# Altium footprint library BGA.PcbLib: 34 footprints (part 1 of 4)
Each footprint in its own frame and in the unit in brackets; x right, y up, seen from the top. Pads: shape width x height; smd on the part's side, far side on the other; paste and mask are expansions set on the pad; w line width, h text height; cw(c..) or ccw(c..) is an arc to the next point about the centre after c.
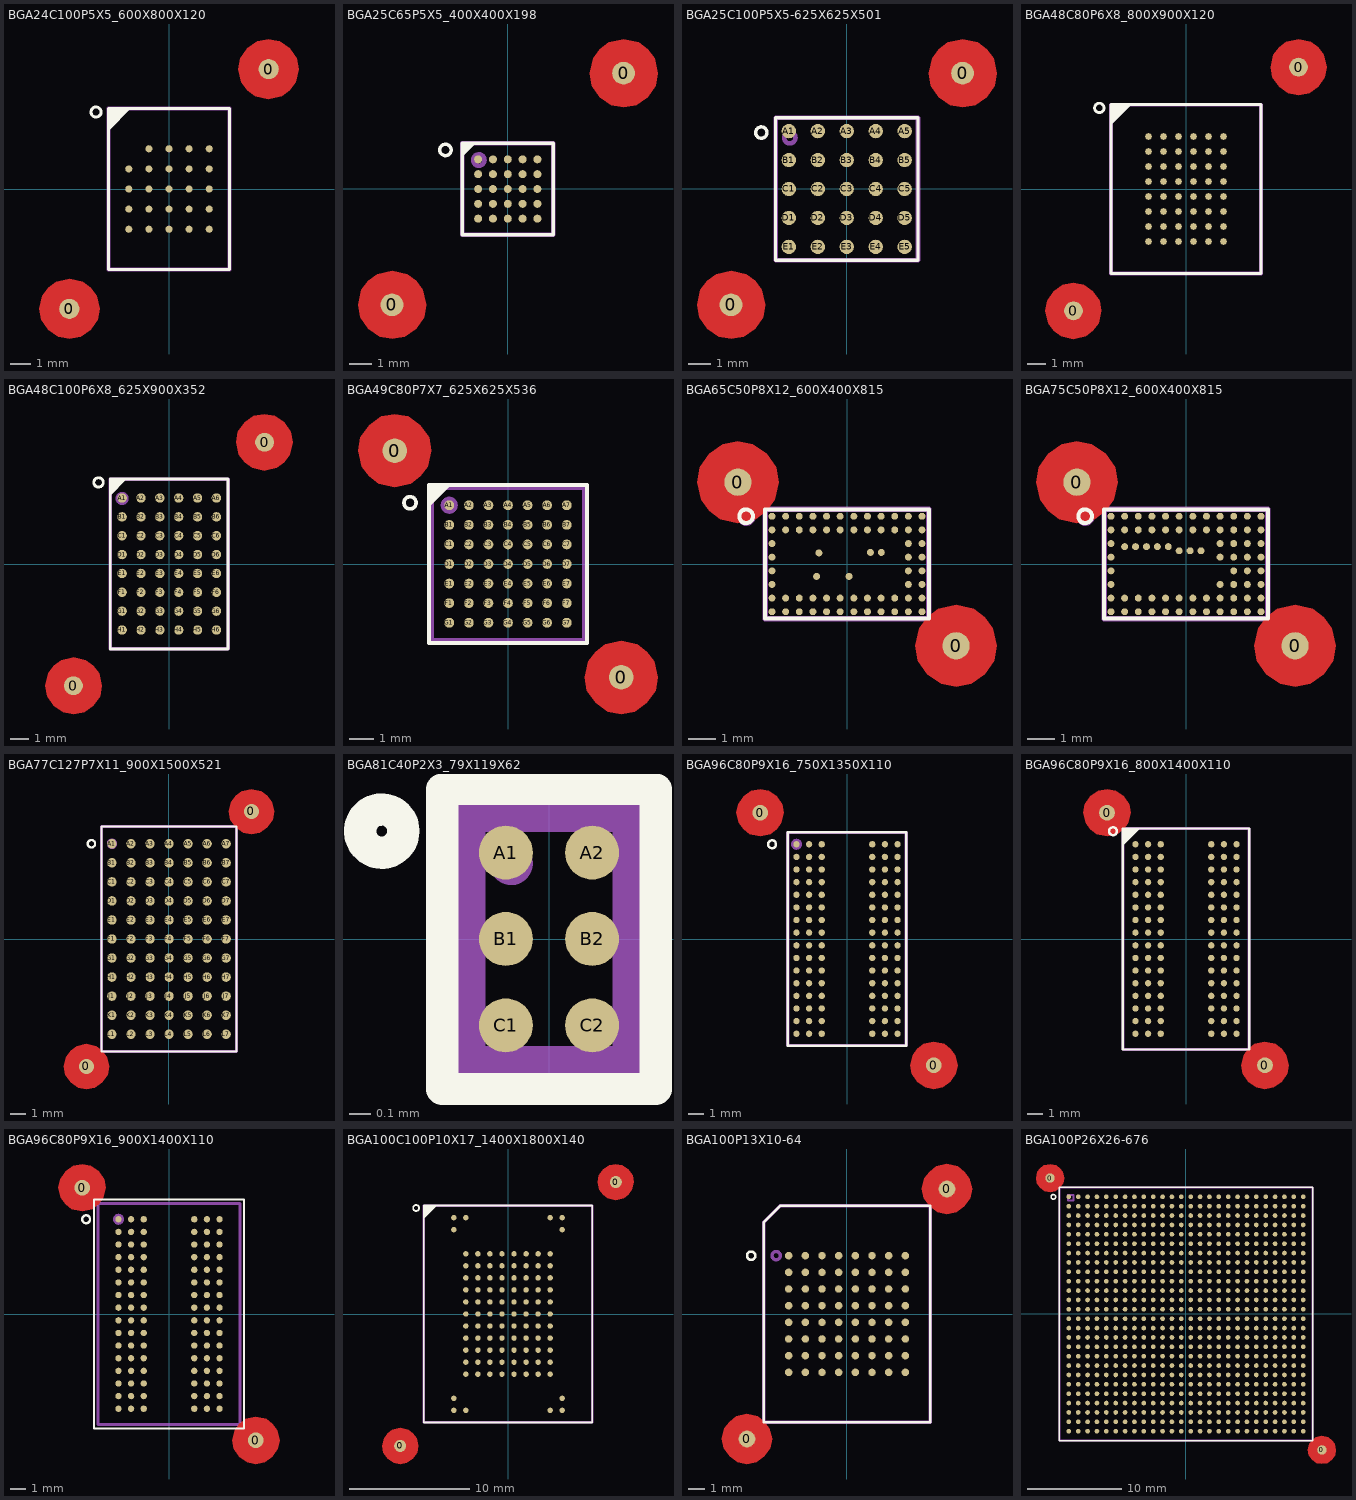
[diagram p0: the footprints below, top view; thin cyan lines are the x and y axes]

## BGA24C100P5X5_600X800X120 [mm] "BGA, 24-Leads, Body 6,00x8,00mmx1,20mm, Pitch 1,00mm"
height 1.2
pads (26):
  round 1 smd paste-1: 0(-4.955,-5.955) 0(4.955,5.955)
  round 0.35 smd paste+0 mask+0.05: A2(-1,2) A3(0,2) A4(1,2) A5(2,2) B1(-2,1) B2(-1,1) B3(0,1) B4(1,1) B5(2,1) C1(-2,0) C2(-1,0) C3(0,0) C4(1,0) C5(2,0) D1(-2,-1) D2(-1,-1) D3(0,-1) D4(1,-1) D5(2,-1) E1(-2,-2) E2(-1,-2) E3(0,-2) E4(1,-2) E5(2,-2)
Top Layer:
  pour cut-out: 6.445,5.955 6.345,6.505 5.995,7.005 5.495,7.355 4.945,7.455 4.395,7.355 3.895,7.005 3.545,6.505 3.445,5.955 3.595,5.305 3.895,4.905 4.295,4.605 4.945,4.455 5.595,4.605 5.995,4.905 6.295,5.305
  pour cut-out: -6.445,-5.955 -6.345,-6.505 -5.995,-7.005 -5.495,-7.355 -4.945,-7.455 -4.395,-7.355 -3.895,-7.005 -3.545,-6.505 -3.445,-5.955 -3.595,-5.305 -3.895,-4.905 -4.295,-4.605 -4.945,-4.455 -5.595,-4.605 -5.995,-4.905 -6.295,-5.305
Top Overlay:
  circle w0.15: c-3.625,3.825 r0.25
  region: -2,4 -3,3 -3,4
  lines w0.15: -3,3 -2,4 ; -3,-4 3,-4 3,4 -3,4 -3,-4
Mechanical 1:
  lines w0.2: -3,-4 3,-4 3,4 -3,4 -3,-4
3D body "BGA25C100P5X5_600X800X120.step": height 1.2, standoff 0, extent -3,-4 3,4

## BGA25C65P5X5_400X400X198 [mm] "BGA, 25-Leads, 5 columns X 5 rows, Body 4,00x4,00mmx1,98mm, Pitch 0,65mm"
height 1.98
pads (27):
  round 1 smd paste-1: 0(-5.08,-5.08) 0(5.08,5.08)
  round 0.35 smd paste+0 mask+0.05: A1(-1.3,1.3) A2(-0.65,1.3) A3(0,1.3) A4(0.65,1.3) A5(1.3,1.3) B1(-1.3,0.65) B2(-0.65,0.65) B3(0,0.65) B4(0.65,0.65) B5(1.3,0.65) C1(-1.3,0) C2(-0.65,0) C3(0,0) C4(0.65,0) C5(1.3,0) D1(-1.3,-0.65) D2(-0.65,-0.65) D3(0,-0.65) D4(0.65,-0.65) D5(1.3,-0.65) E1(-1.3,-1.3) E2(-0.65,-1.3) E3(0,-1.3) E4(0.65,-1.3) E5(1.3,-1.3)
Top Layer:
  pour cut-out: -6.57,-5.08 -6.47,-5.63 -6.12,-6.13 -5.62,-6.48 -5.07,-6.58 -4.52,-6.48 -4.02,-6.13 -3.67,-5.63 -3.57,-5.08 -3.72,-4.43 -4.02,-4.03 -4.42,-3.73 -5.07,-3.58 -5.72,-3.73 -6.12,-4.03 -6.42,-4.43
  pour cut-out: 3.59,5.08 3.69,4.53 4.04,4.03 4.54,3.68 5.09,3.58 5.64,3.68 6.14,4.03 6.49,4.53 6.59,5.08 6.44,5.73 6.14,6.13 5.74,6.43 5.09,6.58 4.44,6.43 4.04,6.13 3.74,5.73
Top Overlay:
  circle w0.15: c-2.734,1.713 r0.25
  region: -1.5,2 -2,1.5 -2,2
  lines w0.15: -2,1.5 -1.5,2 ; -2,-2 -2,2 2,2 2,-2 -2,-2
Mechanical 1:
  circle w0.2: c-1.27,1.27 r0.25
  lines w0.2: -2,-2 -2,2 2,2 2,-2 -2,-2
3D body "BGA25C65P5X5_400X400X198.step": height 1.98, standoff 0, extent -2,-2 2,2

## BGA25C100P5X5-625X625X501 [mm] "BGA, 1.27mm pitch, square; 25 pin, 5 columns X 5 rows, 6.25mm X 6.25mm X 5.01mm"
height 5.21
pads (27):
  round 1 smd paste-1: 0(-5.08,-5.08) 0(5.08,5.08)
  round 0.63 smd paste+0 mask+0.05: A1(-2.54,2.54) A2(-1.27,2.54) A3(0,2.54) A4(1.27,2.54) A5(2.54,2.54) B1(-2.54,1.27) B2(-1.27,1.27) B3(0,1.27) B4(1.27,1.27) B5(2.54,1.27) C1(-2.54,0) C2(-1.27,0) C3(0,0) C4(1.27,0) C5(2.54,0) D1(-2.54,-1.27) D2(-1.27,-1.27) D3(0,-1.27) D4(1.27,-1.27) D5(2.54,-1.27) E1(-2.54,-2.54) E2(-1.27,-2.54) E3(0,-2.54) E4(1.27,-2.54) E5(2.54,-2.54)
Top Layer:
  pour cut-out: -6.57,-5.08 -6.47,-5.63 -6.12,-6.13 -5.62,-6.48 -5.07,-6.58 -4.52,-6.48 -4.02,-6.13 -3.67,-5.63 -3.57,-5.08 -3.72,-4.43 -4.02,-4.03 -4.42,-3.73 -5.07,-3.58 -5.72,-3.73 -6.12,-4.03 -6.42,-4.43
  pour cut-out: 3.59,5.08 3.69,4.53 4.04,4.03 4.54,3.68 5.09,3.58 5.64,3.68 6.14,4.03 6.49,4.53 6.59,5.08 6.44,5.73 6.14,6.13 5.74,6.43 5.09,6.58 4.44,6.43 4.04,6.13 3.74,5.73
Top Overlay:
  circle w0.15: c-3.75,2.475 r0.25
  lines w0.15: -3.125,-3.125 -3.125,3.125 3.125,3.125 3.125,-3.125 -3.125,-3.125
Mechanical 1:
  circle w0.2: c-2.5,2.25 r0.25
  lines w0.2: -3.125,-3.125 -3.125,3.125 3.125,3.125 3.125,-3.125 -3.125,-3.125
3D body "BGA Package 25-Lead.stp": height 5.2, standoff -0.01, extent -3.125,-3.125 3.125,3.125

## BGA48C80P6X8_800X900X120 [mm] "BGA, 48-Leads, Body 8,00x9,00mmx1,20mm, Pitch 0,80mm"
height 1.2
pads (50):
  round 1 smd paste-1: 0(-6,-6.5) 0(6,6.5)
  round 0.35 smd paste+0 mask+0.05: A1(-2,2.8) A2(-1.2,2.8) A3(-0.4,2.8) A4(0.4,2.8) A5(1.2,2.8) A6(2,2.8) B1(-2,2) B2(-1.2,2) B3(-0.4,2) B4(0.4,2) B5(1.2,2) B6(2,2) C1(-2,1.2) C2(-1.2,1.2) C3(-0.4,1.2) C4(0.4,1.2) C5(1.2,1.2) C6(2,1.2) D1(-2,0.4) D2(-1.2,0.4) D3(-0.4,0.4) D4(0.4,0.4) D5(1.2,0.4) D6(2,0.4) E1(-2,-0.4) E2(-1.2,-0.4) E3(-0.4,-0.4) E4(0.4,-0.4) E5(1.2,-0.4) E6(2,-0.4) F1(-2,-1.2) F2(-1.2,-1.2) F3(-0.4,-1.2) F4(0.4,-1.2) F5(1.2,-1.2) F6(2,-1.2) G1(-2,-2) G2(-1.2,-2) G3(-0.4,-2) G4(0.4,-2) G5(1.2,-2) G6(2,-2) H1(-2,-2.8) H2(-1.2,-2.8) H3(-0.4,-2.8) H4(0.4,-2.8) H5(1.2,-2.8) H6(2,-2.8)
Top Layer:
  pour cut-out: 4.51,6.5 4.61,5.95 4.96,5.45 5.46,5.1 6.01,5 6.56,5.1 7.06,5.45 7.41,5.95 7.51,6.5 7.36,7.15 7.06,7.55 6.66,7.85 6.01,8 5.36,7.85 4.96,7.55 4.66,7.15
  pour cut-out: -4.51,-6.5 -4.61,-5.95 -4.96,-5.45 -5.46,-5.1 -6.01,-5 -6.56,-5.1 -7.06,-5.45 -7.41,-5.95 -7.51,-6.5 -7.36,-7.15 -7.06,-7.55 -6.66,-7.85 -6.01,-8 -5.36,-7.85 -4.96,-7.55 -4.66,-7.15
Top Overlay:
  circle w0.15: c-4.625,4.325 r0.25
  region: -3,4.5 -4,3.5 -4,4.5
  lines w0.15: -4,3.5 -3,4.5 ; -4,-4.5 4,-4.5 4,4.5 -4,4.5 -4,-4.5
Mechanical 1:
  lines w0.2: -4,-4.5 4,-4.5 4,4.5 -4,4.5 -4,-4.5
3D body "FS48.stp": height 1.17, standoff 0.01, extent -4,-4.5 4,4.5

## BGA48C100P6X8_625X900X352 [mm] "BGA, 48-Leads, Body 6,25x9,00mmx3,52mm, Pitch 1,00mm"
height 3.52
pads (50):
  round 1 smd paste-1: 0(-5.08,-6.455) 0(5.055,6.455)
  round 0.5 smd paste+0 mask+0.05: A1(-2.5,3.5) A2(-1.5,3.5) A3(-0.5,3.5) A4(0.5,3.5) A5(1.5,3.5) A6(2.5,3.5) B1(-2.5,2.5) B2(-1.5,2.5) B3(-0.5,2.5) B4(0.5,2.5) B5(1.5,2.5) B6(2.5,2.5) C1(-2.5,1.5) C2(-1.5,1.5) C3(-0.5,1.5) C4(0.5,1.5) C5(1.5,1.5) C6(2.5,1.5) D1(-2.5,0.5) D2(-1.5,0.5) D3(-0.5,0.5) D4(0.5,0.5) D5(1.5,0.5) D6(2.5,0.5) E1(-2.5,-0.5) E2(-1.5,-0.5) E3(-0.5,-0.5) E4(0.5,-0.5) E5(1.5,-0.5) E6(2.5,-0.5) F1(-2.5,-1.5) F2(-1.5,-1.5) F3(-0.5,-1.5) F4(0.5,-1.5) F5(1.5,-1.5) F6(2.5,-1.5) G1(-2.5,-2.5) G2(-1.5,-2.5) G3(-0.5,-2.5) G4(0.5,-2.5) G5(1.5,-2.5) G6(2.5,-2.5) H1(-2.5,-3.5) H2(-1.5,-3.5) H3(-0.5,-3.5) H4(0.5,-3.5) H5(1.5,-3.5) H6(2.5,-3.5)
Top Layer:
  pour cut-out: 6.545,6.455 6.445,7.005 6.095,7.505 5.595,7.855 5.045,7.955 4.495,7.855 3.995,7.505 3.645,7.005 3.545,6.455 3.695,5.805 3.995,5.405 4.395,5.105 5.045,4.955 5.695,5.105 6.095,5.405 6.395,5.805
  pour cut-out: -6.57,-6.455 -6.47,-7.005 -6.12,-7.505 -5.62,-7.855 -5.07,-7.955 -4.52,-7.855 -4.02,-7.505 -3.67,-7.005 -3.57,-6.455 -3.72,-5.805 -4.02,-5.405 -4.42,-5.105 -5.07,-4.955 -5.72,-5.105 -6.12,-5.405 -6.42,-5.805
Top Overlay:
  circle w0.15: c-3.75,4.325 r0.25
  region: -2.349,4.5 -3.125,3.724 -3.125,4.5
  lines w0.15: -3.125,3.724 -2.349,4.5 ; -3.125,-4.5 3.125,-4.5 3.125,4.5 -3.125,4.5 -3.125,-4.5
Mechanical 1:
  circle w0.2: c-2.5,3.475 r0.25
  lines w0.2: -3.125,-4.5 3.125,-4.5 3.125,4.5 -3.125,4.5 -3.125,-4.5
3D body "BGA48C100P6X8_625X900X352.step": height 3.52, standoff 0, extent -3.125,-4.5 3.125,4.5

## BGA49C80P7X7_625X625X536 [mm] "BGA, 49-Leads, Body 6,25x6,25mmx5,36mm, Pitch 0,80mm"
height 5.36
pads (51):
  round 1 smd paste-1: 0(-4.625,4.625) 0(4.625,-4.625)
  round 0.4 smd mask+0: A1(-2.4,2.4) A2(-1.6,2.4) A3(-0.8,2.4) A4(0,2.4) A5(0.8,2.4) A6(1.6,2.4) A7(2.4,2.4) B1(-2.4,1.6) B2(-1.6,1.6) B3(-0.8,1.6) B4(0,1.6) B5(0.8,1.6) B6(1.6,1.6) B7(2.4,1.6) C1(-2.4,0.8) C2(-1.6,0.8) C3(-0.8,0.8) C4(0,0.8) C5(0.8,0.8) C6(1.6,0.8) C7(2.4,0.8) D1(-2.4,0) D2(-1.6,0) D3(-0.8,0) D4(0,0) D5(0.8,0) D6(1.6,0) D7(2.4,0) E1(-2.4,-0.8) E2(-1.6,-0.8) E3(-0.8,-0.8) E4(0,-0.8) E5(0.8,-0.8) E6(1.6,-0.8) E7(2.4,-0.8) F1(-2.4,-1.6) F2(-1.6,-1.6) F3(-0.8,-1.6) F4(0,-1.6) F5(0.8,-1.6) F6(1.6,-1.6) F7(2.4,-1.6) G1(-2.4,-2.4) G2(-1.6,-2.4) G3(-0.8,-2.4) G4(0,-2.4) G5(0.8,-2.4) G6(1.6,-2.4) G7(2.4,-2.4)
Top Layer:
  pour cut-out: 3.125,-4.625 3.225,-5.175 3.575,-5.675 4.075,-6.025 4.625,-6.125 5.175,-6.025 5.675,-5.675 6.025,-5.175 6.125,-4.625 5.975,-3.975 5.675,-3.575 5.275,-3.275 4.625,-3.125 3.975,-3.275 3.575,-3.575 3.275,-3.975
  pour cut-out: -3.125,4.625 -3.225,5.175 -3.575,5.675 -4.075,6.025 -4.625,6.125 -5.175,6.025 -5.675,5.675 -6.025,5.175 -6.125,4.625 -5.975,3.975 -5.675,3.575 -5.275,3.275 -4.625,3.125 -3.975,3.275 -3.575,3.575 -3.275,3.975
Top Overlay:
  circle w0.15: c-4,2.5 r0.25
  region: -2.424,3.225 -3.225,2.424 -3.225,3.225
  lines w0.15: -3.225,2.424 -2.424,3.225 ; -3.225,-3.225 -3.225,3.225 3.225,3.225 3.225,-3.225 -3.225,-3.225
Mechanical 1:
  circle w0.2: c-2.4,2.4 r0.25
  lines w0.2: -3.125,-3.125 -3.125,3.125 3.125,3.125 3.125,-3.125 -3.125,-3.125
3D body "BGA49C80P7X7_625X625X536.step": height 5.36, standoff 0, extent -3.125,-3.125 3.125,3.125

## BGA65C50P8X12_600X400X815 [mm] "BGA, 65-Leads, Body 6x4mmx0,815mm, Pitch 0,50mm"
height 0.815
pads (67):
  round 1 smd paste-1: 0(-4,3) 0(4,-3)
  round 0.254 smd paste+0 mask+0.05: A1(-2.75,1.75) A2(-2.25,1.75) A3(-1.75,1.75) A4(-1.25,1.75) A5(-0.75,1.75) A6(-0.25,1.75) A7(0.25,1.75) A8(0.75,1.75) A9(1.25,1.75) A10(1.75,1.75) A11(2.25,1.75) A12(2.75,1.75) B1(-2.75,1.25) B2(-2.25,1.25) B3(-1.75,1.25) B4(-1.25,1.25) B5(-0.75,1.25) B6(-0.25,1.25) B7(0.25,1.25) B8(0.75,1.25) B9(1.25,1.25) B10(1.75,1.25) B11(2.25,1.25) B12(2.75,1.25) C1(-2.75,0.75) C11(2.25,0.75) C12(2.75,0.75) D1(-2.75,0.25) D11(2.25,0.25) D12(2.75,0.25) E1(-2.75,-0.25) E11(2.25,-0.25) E12(2.75,-0.25) EPAD3(-1.03,0.406) EPAD4(0.075,-0.455) EPAD5(-1.115,-0.455) F1(-2.75,-0.75) F11(2.25,-0.75) F12(2.75,-0.75) G1(-2.75,-1.25) G2(-2.25,-1.25) G3(-1.75,-1.25) G4(-1.25,-1.25) G5(-0.75,-1.25) G6(-0.25,-1.25) G7(0.25,-1.25) G8(0.75,-1.25) G9(1.25,-1.25) G10(1.75,-1.25) G11(2.25,-1.25) G12(2.75,-1.25) H1(-2.75,-1.75) H2(-2.25,-1.75) H3(-1.75,-1.75) H4(-1.25,-1.75) H5(-0.75,-1.75) H6(-0.25,-1.75) H7(0.25,-1.75) H8(0.75,-1.75) H9(1.25,-1.75) H10(1.75,-1.75) H11(2.25,-1.75) H12(2.75,-1.75)
  round 0.254 smd paste+0 mask+0.03: EPAD1(1.258,0.425)
  round 0.254 smd mask+0.03: EPAD2(0.858,0.425)
Top Layer:
  pour cut-out: -2.5,3 -2.6,3.55 -2.95,4.05 -3.45,4.4 -4,4.5 -4.55,4.4 -5.05,4.05 -5.4,3.55 -5.5,3 -5.35,2.35 -5.05,1.95 -4.65,1.65 -4,1.5 -3.35,1.65 -2.95,1.95 -2.65,2.35
  pour cut-out: 2.5,-3 2.6,-3.55 2.95,-4.05 3.45,-4.4 4,-4.5 4.55,-4.4 5.05,-4.05 5.4,-3.55 5.5,-3 5.35,-2.35 5.05,-1.95 4.65,-1.65 4,-1.5 3.35,-1.65 2.95,-1.95 2.65,-2.35
Top Overlay:
  circle w0.15: c-3.7,1.75 r0.25
  lines w0.15: -3,-2 3,-2 3,2 -3,2 -3,-2
Mechanical 1:
  circle w0.2: c-3.7,1.75 r0.25
  lines w0.2: -3,-2 3,-2 3,2 -3,2 -3,-2
3D body "HMC6300BG46.stp": height 0.57, standoff -0.19, extent -3,-2 3,2

## BGA75C50P8X12_600X400X815 [mm] "BGA, 75-Leads, Body 6x4mmx0,815mm, Pitch 0,50mm"
height 0.815
pads (77):
  round 1 smd paste-1: 0(-4,3) 0(4,-3)
  round 0.254 smd paste+0 mask+0.05: A1(-2.75,1.75) A2(-2.25,1.75) A3(-1.75,1.75) A4(-1.25,1.75) A5(-0.75,1.75) A6(-0.25,1.75) A7(0.25,1.75) A8(0.75,1.75) A9(1.25,1.75) A10(1.75,1.75) A11(2.25,1.75) A12(2.75,1.75) B1(-2.75,1.25) B2(-2.25,1.25) B3(-1.75,1.25) B4(-1.25,1.25) B5(-0.75,1.25) B6(-0.25,1.25) B7(0.25,1.25) B8(0.75,1.25) B9(1.25,1.25) B10(1.75,1.25) B11(2.25,1.25) B12(2.75,1.25) C1(-2.75,0.75) C9(1.25,0.75) C10(1.75,0.75) C11(2.25,0.75) C12(2.75,0.75) D1(-2.75,0.25) D9(1.25,0.25) D10(1.75,0.25) D11(2.25,0.25) D12(2.75,0.25) E1(-2.75,-0.25) E10(1.75,-0.25) E11(2.25,-0.25) E12(2.75,-0.25) F1(-2.75,-0.75) F9(1.25,-0.75) F10(1.75,-0.75) F11(2.25,-0.75) F12(2.75,-0.75) G1(-2.75,-1.25) G2(-2.25,-1.25) G3(-1.75,-1.25) G4(-1.25,-1.25) G5(-0.75,-1.25) G6(-0.25,-1.25) G7(0.25,-1.25) G8(0.75,-1.25) G9(1.25,-1.25) G10(1.75,-1.25) G11(2.25,-1.25) G12(2.75,-1.25) H1(-2.75,-1.75) H2(-2.25,-1.75) H3(-1.75,-1.75) H4(-1.25,-1.75) H5(-0.75,-1.75) H6(-0.25,-1.75) H7(0.25,-1.75) H8(0.75,-1.75) H9(1.25,-1.75) H10(1.75,-1.75) H11(2.25,-1.75) H12(2.75,-1.75)
  round 0.254 smd paste+0 mask+0.03: EPAD1(0.55,0.485) EPAD2(0.15,0.485) EPAD3(-0.25,0.485) EPAD4(-0.65,0.635) EPAD5(-1.05,0.635) EPAD6(-1.45,0.635) EPAD7(-1.85,0.635) EPAD8(-2.25,0.635)
Top Layer:
  pour cut-out: 2.5,-3 2.6,-3.55 2.95,-4.05 3.45,-4.4 4,-4.5 4.55,-4.4 5.05,-4.05 5.4,-3.55 5.5,-3 5.35,-2.35 5.05,-1.95 4.65,-1.65 4,-1.5 3.35,-1.65 2.95,-1.95 2.65,-2.35
  pour cut-out: -2.5,3 -2.6,3.55 -2.95,4.05 -3.45,4.4 -4,4.5 -4.55,4.4 -5.05,4.05 -5.4,3.55 -5.5,3 -5.35,2.35 -5.05,1.95 -4.65,1.65 -4,1.5 -3.35,1.65 -2.95,1.95 -2.65,2.35
Top Overlay:
  circle w0.15: c-3.7,1.75 r0.25
  lines w0.15: -3,-2 -3,2 3,2 3,-2 -3,-2
Mechanical 1:
  circle w0.2: c-3.7,1.75 r0.25
  lines w0.2: -3,-2 -3,2 3,2 3,-2 -3,-2
3D body "HMC6301BG46.stp": height 0.57, standoff -0.19, extent -3,-2 3,2

## BGA77C127P7X11_900X1500X521 [mm] "BGA, 77-Leads, Body 9,00x15,00mmx5,21mm, Pitch 1,27mm"
height 5.21
pads (79):
  round 1 smd paste-1: 0(-5.5,-8.5) 0(5.5,8.5)
  round 0.63 smd: A1(-3.81,6.35) A2(-2.54,6.35) A3(-1.27,6.35) A4(0,6.35) A5(1.27,6.35) A6(2.54,6.35) A7(3.81,6.35) B1(-3.81,5.08) B2(-2.54,5.08) B3(-1.27,5.08) B4(0,5.08) B5(1.27,5.08) B6(2.54,5.08) B7(3.81,5.08) C1(-3.81,3.81) C2(-2.54,3.81) C3(-1.27,3.81) C4(0,3.81) C5(1.27,3.81) C6(2.54,3.81) C7(3.81,3.81) D1(-3.81,2.54) D2(-2.54,2.54) D3(-1.27,2.54) D4(0,2.54) D5(1.27,2.54) D6(2.54,2.54) D7(3.81,2.54) E1(-3.81,1.27) E2(-2.54,1.27) E3(-1.27,1.27) E4(0,1.27) E5(1.27,1.27) E6(2.54,1.27) E7(3.81,1.27) F1(-3.81,0) F2(-2.54,0) F3(-1.27,0) F4(0,0) F5(1.27,0) F6(2.54,0) F7(3.81,0) G1(-3.81,-1.27) G2(-2.54,-1.27) G3(-1.27,-1.27) G4(0,-1.27) G5(1.27,-1.27) G6(2.54,-1.27) G7(3.81,-1.27) H1(-3.81,-2.54) H2(-2.54,-2.54) H3(-1.27,-2.54) H4(0,-2.54) H5(1.27,-2.54) H6(2.54,-2.54) H7(3.81,-2.54) J1(-3.81,-3.81) J2(-2.54,-3.81) J3(-1.27,-3.81) J4(0,-3.81) J5(1.27,-3.81) J6(2.54,-3.81) J7(3.81,-3.81) K1(-3.81,-5.08) K2(-2.54,-5.08) K3(-1.27,-5.08) K4(0,-5.08) K5(1.27,-5.08) K6(2.54,-5.08) K7(3.81,-5.08) L1(-3.81,-6.35) L2(-2.54,-6.35) L3(-1.27,-6.35) L4(0,-6.35) L5(1.27,-6.35) L6(2.54,-6.35) L7(3.81,-6.35)
Top Layer:
  pour cut-out: 4,8.5 4.1,7.95 4.45,7.45 4.95,7.1 5.5,7 6.05,7.1 6.55,7.45 6.9,7.95 7,8.5 6.85,9.15 6.55,9.55 6.15,9.85 5.5,10 4.85,9.85 4.45,9.55 4.15,9.15
  pour cut-out: -7,-8.5 -6.9,-9.05 -6.55,-9.55 -6.05,-9.9 -5.5,-10 -4.95,-9.9 -4.45,-9.55 -4.1,-9.05 -4,-8.5 -4.15,-7.85 -4.45,-7.45 -4.85,-7.15 -5.5,-7 -6.15,-7.15 -6.55,-7.45 -6.85,-7.85
Top Overlay:
  circle w0.15: c-5.175,6.35 r0.25
  lines w0.15: -4.5,-7.5 -4.5,7.5 4.5,7.5 4.5,-7.5 -4.5,-7.5
Mechanical 1:
  circle w0.2: c-3.8,6.35 r0.25
  lines w0.2: -4.5,-7.5 -4.5,7.5 4.5,7.5 4.5,-7.5 -4.5,-7.5
3D body "BGA77.stp": height 5.01, standoff 0, extent -4.525,-7.5 4.475,7.5

## BGA81C40P2X3_79X119X62 [mm] "BGA, 81-Leads, Body 0,79x1,19mmx0,63mm, Pitch 0,40mm"
height 0.63
pads (6):
  round 0.25 smd paste+0 mask+0.05: A1(-0.2,0.4)
  round 0.25 smd mask+0.05: A2(0.2,0.4) B1(-0.2,0) B2(0.2,0) C1(-0.2,-0.4) C2(0.2,-0.4)
Top Overlay:
  circle w0.15: c-0.775,0.5 r0.1
  lines w0.15: -0.495,-0.695 0.495,-0.695 0.495,-0.437 0.495,0.437 0.495,0.695 -0.495,0.695 -0.495,-0.695
Mechanical 1:
  circle w0.1: c-0.175,0.35 r0.05
  lines w0.2: -0.395,-0.595 -0.395,0.595 0.395,0.595 0.395,-0.595 -0.395,-0.595
3D body "YFF.stp": height 0.64, standoff 0.01, extent -0.4,-0.595 0.39,0.595

## BGA96C80P9X16_750X1350X110 [mm] "BGA, 96-Leads, Body 7,5x13,5mmx1,10mm, Pitch 0,80mm"
height 1.2
pads (98):
  round 1 smd paste-1: 0(-5.5,8) 0(5.5,-8)
  round 0.4 smd paste+0 mask+0.05: A1(-3.2,6) A2(-2.4,6) A3(-1.6,6) A7(1.6,6) A8(2.4,6) A9(3.2,6) B1(-3.2,5.2) B2(-2.4,5.2) B3(-1.6,5.2) B7(1.6,5.2) B8(2.4,5.2) B9(3.2,5.2) C1(-3.2,4.4) C2(-2.4,4.4) C3(-1.6,4.4) C7(1.6,4.4) C8(2.4,4.4) C9(3.2,4.4) D1(-3.2,3.6) D2(-2.4,3.6) D3(-1.6,3.6) D7(1.6,3.6) D8(2.4,3.6) D9(3.2,3.6) E1(-3.2,2.8) E2(-2.4,2.8) E3(-1.6,2.8) E7(1.6,2.8) E8(2.4,2.8) E9(3.2,2.8) F1(-3.2,2) F2(-2.4,2) F3(-1.6,2) F7(1.6,2) F8(2.4,2) F9(3.2,2) G1(-3.2,1.2) G2(-2.4,1.2) G3(-1.6,1.2) G7(1.6,1.2) G8(2.4,1.2) G9(3.2,1.2) H1(-3.2,0.4) H2(-2.4,0.4) H3(-1.6,0.4) H7(1.6,0.4) H8(2.4,0.4) H9(3.2,0.4) J1(-3.2,-0.4) J2(-2.4,-0.4) J3(-1.6,-0.4) J7(1.6,-0.4) J8(2.4,-0.4) J9(3.2,-0.4) K1(-3.2,-1.2) K2(-2.4,-1.2) K3(-1.6,-1.2) K7(1.6,-1.2) K8(2.4,-1.2) K9(3.2,-1.2) L1(-3.2,-2) L2(-2.4,-2) L3(-1.6,-2) L7(1.6,-2) L8(2.4,-2) L9(3.2,-2) M1(-3.2,-2.8) M2(-2.4,-2.8) M3(-1.6,-2.8) M7(1.6,-2.8) M8(2.4,-2.8) M9(3.2,-2.8) N1(-3.2,-3.6) N2(-2.4,-3.6) N3(-1.6,-3.6) N7(1.6,-3.6) N8(2.4,-3.6) N9(3.2,-3.6) P1(-3.2,-4.4) P2(-2.4,-4.4) P3(-1.6,-4.4) P7(1.6,-4.4) P8(2.4,-4.4) P9(3.2,-4.4) R1(-3.2,-5.2) R2(-2.4,-5.2) R3(-1.6,-5.2) R7(1.6,-5.2) R8(2.4,-5.2) R9(3.2,-5.2) T1(-3.2,-6) T2(-2.4,-6) T3(-1.6,-6) T7(1.6,-6) T8(2.4,-6) T9(3.2,-6)
Top Layer:
  pour cut-out: -4,8 -4.1,8.55 -4.45,9.05 -4.95,9.4 -5.5,9.5 -6.05,9.4 -6.55,9.05 -6.9,8.55 -7,8 -6.85,7.35 -6.55,6.95 -6.15,6.65 -5.5,6.5 -4.85,6.65 -4.45,6.95 -4.15,7.35
  pour cut-out: 4,-8 4.1,-8.55 4.45,-9.05 4.95,-9.4 5.5,-9.5 6.05,-9.4 6.55,-9.05 6.9,-8.55 7,-8 6.85,-7.35 6.55,-6.95 6.15,-6.65 5.5,-6.5 4.85,-6.65 4.45,-6.95 4.15,-7.35
Top Overlay:
  circle w0.15: c-4.75,6 r0.25
  lines w0.15: -3.75,-6.75 3.75,-6.75 3.75,6.75 -3.75,6.75 -3.75,-6.75
Mechanical 1:
  circle w0.2: c-3.2,6 r0.25
  lines w0.2: -3.75,-6.75 -3.75,6.75 3.75,6.75 3.75,-6.75 -3.75,-6.75
3D body "96-Ball FBGA – x16 (LY).stp": height 1.1, standoff 0, extent -3.75,-6.75 3.75,6.75

## BGA96C80P9X16_800X1400X110 [mm] "BGA, 96-Leads, Body 8,00x14,00mmx1,10mm, Pitch 0,80mm"
height 1.2
pads (98):
  round 1 smd paste-1: 0(-5,8) 0(5,-8)
  round 0.4 smd paste+0 mask+0.05: A1(-3.2,6) A2(-2.4,6) A3(-1.6,6) A7(1.6,6) A8(2.4,6) A9(3.2,6) B1(-3.2,5.2) B2(-2.4,5.2) B3(-1.6,5.2) B7(1.6,5.2) B8(2.4,5.2) B9(3.2,5.2) C1(-3.2,4.4) C2(-2.4,4.4) C3(-1.6,4.4) C7(1.6,4.4) C8(2.4,4.4) C9(3.2,4.4) D1(-3.2,3.6) D2(-2.4,3.6) D3(-1.6,3.6) D7(1.6,3.6) D8(2.4,3.6) D9(3.2,3.6) E1(-3.2,2.8) E2(-2.4,2.8) E3(-1.6,2.8) E7(1.6,2.8) E8(2.4,2.8) E9(3.2,2.8) F1(-3.2,2) F2(-2.4,2) F3(-1.6,2) F7(1.6,2) F8(2.4,2) F9(3.2,2) G1(-3.2,1.2) G2(-2.4,1.2) G3(-1.6,1.2) G7(1.6,1.2) G8(2.4,1.2) G9(3.2,1.2) H1(-3.2,0.4) H2(-2.4,0.4) H3(-1.6,0.4) H7(1.6,0.4) H8(2.4,0.4) H9(3.2,0.4) J1(-3.2,-0.4) J2(-2.4,-0.4) J3(-1.6,-0.4) J7(1.6,-0.4) J8(2.4,-0.4) J9(3.2,-0.4) K1(-3.2,-1.2) K2(-2.4,-1.2) K3(-1.6,-1.2) K7(1.6,-1.2) K8(2.4,-1.2) K9(3.2,-1.2) L1(-3.2,-2) L2(-2.4,-2) L3(-1.6,-2) L7(1.6,-2) L8(2.4,-2) L9(3.2,-2) M1(-3.2,-2.8) M2(-2.4,-2.8) M3(-1.6,-2.8) M7(1.6,-2.8) M8(2.4,-2.8) M9(3.2,-2.8) N1(-3.2,-3.6) N2(-2.4,-3.6) N3(-1.6,-3.6) N7(1.6,-3.6) N8(2.4,-3.6) N9(3.2,-3.6) P1(-3.2,-4.4) P2(-2.4,-4.4) P3(-1.6,-4.4) P7(1.6,-4.4) P8(2.4,-4.4) P9(3.2,-4.4) R1(-3.2,-5.2) R2(-2.4,-5.2) R3(-1.6,-5.2) R7(1.6,-5.2) R8(2.4,-5.2) R9(3.2,-5.2) T1(-3.2,-6) T2(-2.4,-6) T3(-1.6,-6) T7(1.6,-6) T8(2.4,-6) T9(3.2,-6)
Top Layer:
  pour cut-out: -3.5,8 -3.6,8.55 -3.95,9.05 -4.45,9.4 -5,9.5 -5.55,9.4 -6.05,9.05 -6.4,8.55 -6.5,8 -6.35,7.35 -6.05,6.95 -5.65,6.65 -5,6.5 -4.35,6.65 -3.95,6.95 -3.65,7.35
  pour cut-out: 3.5,-8 3.6,-8.55 3.95,-9.05 4.45,-9.4 5,-9.5 5.55,-9.4 6.05,-9.05 6.4,-8.55 6.5,-8 6.35,-7.35 6.05,-6.95 5.65,-6.65 5,-6.5 4.35,-6.65 3.95,-6.95 3.65,-7.35
Top Overlay:
  circle w0.15: c-4.625,6.825 r0.25
  region: -3.013,7 -4,6.013 -4,7
  lines w0.15: -4,6.013 -3.013,7 ; -4,-7 4,-7 4,7 -4,7 -4,-7
Mechanical 1:
  lines w0.2: -4,-7 4,-7 4,7 -4,7 -4,-7
3D body "BGA96C80P9X16_800X1400X110.step": height 1.1, standoff 0, extent -4,-7 4,7

## BGA96C80P9X16_900X1400X110 [mm] "BGA, 96-Leads, Body 9,00x14,00mmx1,10mm, Pitch 0,80mm"
height 1.1
pads (98):
  round 1 smd paste-1: 0(-5.5,8) 0(5.5,-8)
  round 0.4 smd paste+0 mask+0.05: A1(-3.2,6) A2(-2.4,6) A3(-1.6,6) A7(1.6,6) A8(2.4,6) A9(3.2,6) B1(-3.2,5.2) B2(-2.4,5.2) B3(-1.6,5.2) B7(1.6,5.2) B8(2.4,5.2) B9(3.2,5.2) C1(-3.2,4.4) C2(-2.4,4.4) C3(-1.6,4.4) C7(1.6,4.4) C8(2.4,4.4) C9(3.2,4.4) D1(-3.2,3.6) D2(-2.4,3.6) D3(-1.6,3.6) D7(1.6,3.6) D8(2.4,3.6) D9(3.2,3.6) E1(-3.2,2.8) E2(-2.4,2.8) E3(-1.6,2.8) E7(1.6,2.8) E8(2.4,2.8) E9(3.2,2.8) F1(-3.2,2) F2(-2.4,2) F3(-1.6,2) F7(1.6,2) F8(2.4,2) F9(3.2,2) G1(-3.2,1.2) G2(-2.4,1.2) G3(-1.6,1.2) G7(1.6,1.2) G8(2.4,1.2) G9(3.2,1.2) H1(-3.2,0.4) H2(-2.4,0.4) H3(-1.6,0.4) H7(1.6,0.4) H8(2.4,0.4) H9(3.2,0.4) J1(-3.2,-0.4) J2(-2.4,-0.4) J3(-1.6,-0.4) J7(1.6,-0.4) J8(2.4,-0.4) J9(3.2,-0.4) K1(-3.2,-1.2) K2(-2.4,-1.2) K3(-1.6,-1.2) K7(1.6,-1.2) K8(2.4,-1.2) K9(3.2,-1.2) L1(-3.2,-2) L2(-2.4,-2) L3(-1.6,-2) L7(1.6,-2) L8(2.4,-2) L9(3.2,-2) M1(-3.2,-2.8) M2(-2.4,-2.8) M3(-1.6,-2.8) M7(1.6,-2.8) M8(2.4,-2.8) M9(3.2,-2.8) N1(-3.2,-3.6) N2(-2.4,-3.6) N3(-1.6,-3.6) N7(1.6,-3.6) N8(2.4,-3.6) N9(3.2,-3.6) P1(-3.2,-4.4) P2(-2.4,-4.4) P3(-1.6,-4.4) P7(1.6,-4.4) P8(2.4,-4.4) P9(3.2,-4.4) R1(-3.2,-5.2) R2(-2.4,-5.2) R3(-1.6,-5.2) R7(1.6,-5.2) R8(2.4,-5.2) R9(3.2,-5.2) T1(-3.2,-6) T2(-2.4,-6) T3(-1.6,-6) T7(1.6,-6) T8(2.4,-6) T9(3.2,-6)
Top Layer:
  pour cut-out: -4,8 -4.1,8.55 -4.45,9.05 -4.95,9.4 -5.5,9.5 -6.05,9.4 -6.55,9.05 -6.9,8.55 -7,8 -6.85,7.35 -6.55,6.95 -6.15,6.65 -5.5,6.5 -4.85,6.65 -4.45,6.95 -4.15,7.35
  pour cut-out: 4,-8 4.1,-8.55 4.45,-9.05 4.95,-9.4 5.5,-9.5 6.05,-9.4 6.55,-9.05 6.9,-8.55 7,-8 6.85,-7.35 6.55,-6.95 6.15,-6.65 5.5,-6.5 4.85,-6.65 4.45,-6.95 4.15,-7.35
Top Overlay:
  circle w0.15: c-5.25,6 r0.25
  lines w0.15: -4.75,-7.25 4.75,-7.25 4.75,7.25 -4.75,7.25 -4.75,-7.25
Mechanical 1:
  circle w0.2: c-3.2,6 r0.25
  lines w0.2: -4.5,-7 -4.5,7 4.5,7 4.5,-7 -4.5,-7
3D body "MT41K256M16HA-125 IT.stp": height 1.25, standoff 0, extent -4.5,-7 4.5,7

## BGA100C100P10X17_1400X1800X140 [mm] "BGA, 100-Leads, Body 14,00x18 mmx1,40mm, Pitch 1,00mm"
height 1.4
pads (102):
  round 1 smd paste-1: 0(-8.955,-10.955) 0(8.955,10.955)
  round 0.45 smd paste+0 mask+0.05: A1(-4.5,8) A2(-3.5,8) A9(3.5,8) A10(4.5,8) B1(-4.5,7) B10(4.5,7) D2(-3.5,5) D3(-2.5,5) D4(-1.5,5) D5(-0.5,5) D6(0.5,5) D7(1.5,5) D8(2.5,5) D9(3.5,5) E2(-3.5,4) E3(-2.5,4) E4(-1.5,4) E5(-0.5,4) E6(0.5,4) E7(1.5,4) E8(2.5,4) E9(3.5,4) F2(-3.5,3) F3(-2.5,3) F4(-1.5,3) F5(-0.5,3) F6(0.5,3) F7(1.5,3) F8(2.5,3) F9(3.5,3) G2(-3.5,2) G3(-2.5,2) G4(-1.5,2) G5(-0.5,2) G6(0.5,2) G7(1.5,2) G8(2.5,2) G9(3.5,2) H2(-3.5,1) H3(-2.5,1) H4(-1.5,1) H5(-0.5,1) H6(0.5,1) H7(1.5,1) H8(2.5,1) H9(3.5,1) J2(-3.5,0) J3(-2.5,0) J4(-1.5,0) J5(-0.5,0) J6(0.5,0) J7(1.5,0) J8(2.5,0) J9(3.5,0) K2(-3.5,-1) K3(-2.5,-1) K4(-1.5,-1) K5(-0.5,-1) K6(0.5,-1) K7(1.5,-1) K8(2.5,-1) K9(3.5,-1) L2(-3.5,-2) L3(-2.5,-2) L4(-1.5,-2) L5(-0.5,-2) L6(0.5,-2) L7(1.5,-2) L8(2.5,-2) L9(3.5,-2) M2(-3.5,-3) M3(-2.5,-3) M4(-1.5,-3) M5(-0.5,-3) M6(0.5,-3) M7(1.5,-3) M8(2.5,-3) M9(3.5,-3) N2(-3.5,-4) N3(-2.5,-4) N4(-1.5,-4) N5(-0.5,-4) N6(0.5,-4) N7(1.5,-4) N8(2.5,-4) N9(3.5,-4) P2(-3.5,-5) P3(-2.5,-5) P4(-1.5,-5) P5(-0.5,-5) P6(0.5,-5) P7(1.5,-5) P8(2.5,-5) P9(3.5,-5) T1(-4.5,-7) T10(4.5,-7) U1(-4.5,-8) U2(-3.5,-8) U9(3.5,-8) U10(4.5,-8)
Top Layer:
  pour cut-out: -10.445,-10.955 -10.345,-11.505 -9.995,-12.005 -9.495,-12.355 -8.945,-12.455 -8.395,-12.355 -7.895,-12.005 -7.545,-11.505 -7.445,-10.955 -7.595,-10.305 -7.895,-9.905 -8.295,-9.605 -8.945,-9.455 -9.595,-9.605 -9.995,-9.905 -10.295,-10.305
  pour cut-out: 10.445,10.955 10.345,11.505 9.995,12.005 9.495,12.355 8.945,12.455 8.395,12.355 7.895,12.005 7.545,11.505 7.445,10.955 7.595,10.305 7.895,9.905 8.295,9.605 8.945,9.455 9.595,9.605 9.995,9.905 10.295,10.305
Top Overlay:
  circle w0.15: c-7.625,8.8 r0.25
  region: -6,8.975 -7,7.975 -7,8.975
  lines w0.15: -7,-9 7,-9 ; -7,-8.975 -7,8.975 ; -7,7.975 -6,8.975 ; -7,9 7,9 ; 7,-8.975 7,8.975
Mechanical 1:
  lines w0.2: -7,-9 7,-9 ; -7,-8.975 -7,8.975 ; -7,9 7,9 ; 7,-8.975 7,8.975
3D body: height 1.4, standoff 0.32, extent -7,-8.975 7,8.975

## BGA100P13X10-64 [mm] "BGA, 64-Leads, Body 10.0x13.0mm,  Pitch 1.00mm"
height 1.2
pads (66):
  round 1 smd paste-1: 0(-6,-7.5) 0(6,7.5)
  round 0.45 smd paste+0 mask+0.05: A1(-3.5,3.5) A2(-2.5,3.5) A3(-1.5,3.5) A4(-0.5,3.5) A5(0.5,3.5) A6(1.5,3.5) A7(2.5,3.5) A8(3.5,3.5) B1(-3.5,2.5) B2(-2.5,2.5) B3(-1.5,2.5) B4(-0.5,2.5) B5(0.5,2.5) B6(1.5,2.5) B7(2.5,2.5) B8(3.5,2.5) C1(-3.5,1.5) C2(-2.5,1.5) C3(-1.5,1.5) C4(-0.5,1.5) C5(0.5,1.5) C6(1.5,1.5) C7(2.5,1.5) C8(3.5,1.5) D1(-3.5,0.5) D2(-2.5,0.5) D3(-1.5,0.5) D4(-0.5,0.5) D5(0.5,0.5) D6(1.5,0.5) D7(2.5,0.5) D8(3.5,0.5) E1(-3.5,-0.5) E2(-2.5,-0.5) E3(-1.5,-0.5) E4(-0.5,-0.5) E5(0.5,-0.5) E6(1.5,-0.5) E7(2.5,-0.5) E8(3.5,-0.5) F1(-3.5,-1.5) F2(-2.5,-1.5) F3(-1.5,-1.5) F4(-0.5,-1.5) F5(0.5,-1.5) F6(1.5,-1.5) F7(2.5,-1.5) F8(3.5,-1.5) G1(-3.5,-2.5) G2(-2.5,-2.5) G3(-1.5,-2.5) G4(-0.5,-2.5) G5(0.5,-2.5) G6(1.5,-2.5) G7(2.5,-2.5) G8(3.5,-2.5) H1(-3.5,-3.5) H2(-2.5,-3.5) H3(-1.5,-3.5) H4(-0.5,-3.5) H5(0.5,-3.5) H6(1.5,-3.5) H7(2.5,-3.5) H8(3.5,-3.5)
Top Layer:
  pour cut-out: 4.5,7.5 4.6,6.95 4.95,6.45 5.45,6.1 6,6 6.55,6.1 7.05,6.45 7.4,6.95 7.5,7.5 7.35,8.15 7.05,8.55 6.65,8.85 6,9 5.35,8.85 4.95,8.55 4.65,8.15
  pour cut-out: -7.5,-7.5 -7.4,-8.05 -7.05,-8.55 -6.55,-8.9 -6,-9 -5.45,-8.9 -4.95,-8.55 -4.6,-8.05 -4.5,-7.5 -4.65,-6.85 -4.95,-6.45 -5.35,-6.15 -6,-6 -6.65,-6.15 -7.05,-6.45 -7.35,-6.85
Top Overlay:
  circle w0.15: c-5.75,3.5 r0.25
  lines w0.15: -5,-6.5 -5,5.5 -4,6.5 5,6.5 5,-6.5 -5,-6.5
Mechanical 1:
  circle w0.2: c-4.25,3.5 r0.25
  lines w0.2: -5,-6.5 -5,5.5 -4,6.5 5,6.5 5,-6.5 -5,-6.5
3D body "64-Ball Easy BGA.STEP": height 1.01, standoff -0.02, extent -5,-6.5 5,6.5

## BGA100P26X26-676 [mm] "BGA, 676-Leads, Body 27x27mm, Pitch 1mm"
height 2.54
pads (678):
  round 1 smd paste-1: 0(-14.5,14.5) 0(14.5,-14.5)
  round 0.5 smd paste+0 mask+0.05: A1(-12.5,12.5) A2(-11.5,12.5) A3(-10.5,12.5) A4(-9.5,12.5) A5(-8.5,12.5) A6(-7.5,12.5) A7(-6.5,12.5) A8(-5.5,12.5) A9(-4.5,12.5) A10(-3.5,12.5) A11(-2.5,12.5) A12(-1.5,12.5) A13(-0.5,12.5) A14(0.5,12.5) A15(1.5,12.5) A16(2.5,12.5) A17(3.5,12.5) A18(4.5,12.5) A19(5.5,12.5) A20(6.5,12.5) A21(7.5,12.5) A22(8.5,12.5) A23(9.5,12.5) A24(10.5,12.5) A25(11.5,12.5) A26(12.5,12.5) AA1(-12.5,-7.5) AA2(-11.5,-7.5) AA3(-10.5,-7.5) AA4(-9.5,-7.5) AA5(-8.5,-7.5) AA6(-7.5,-7.5) AA7(-6.5,-7.5) AA8(-5.5,-7.5) AA9(-4.5,-7.5) AA10(-3.5,-7.5) AA11(-2.5,-7.5) AA12(-1.5,-7.5) AA13(-0.5,-7.5) AA14(0.5,-7.5) AA15(1.5,-7.5) AA16(2.5,-7.5) AA17(3.5,-7.5) AA18(4.5,-7.5) AA19(5.5,-7.5) AA20(6.5,-7.5) AA21(7.5,-7.5) AA22(8.5,-7.5) AA23(9.5,-7.5) AA24(10.5,-7.5) AA25(11.5,-7.5) AA26(12.5,-7.5) AB1(-12.5,-8.5) AB2(-11.5,-8.5) AB3(-10.5,-8.5) AB4(-9.5,-8.5) AB5(-8.5,-8.5) AB6(-7.5,-8.5) AB7(-6.5,-8.5) AB8(-5.5,-8.5) AB9(-4.5,-8.5) AB10(-3.5,-8.5) AB11(-2.5,-8.5) AB12(-1.5,-8.5) AB13(-0.5,-8.5) AB14(0.5,-8.5) AB15(1.5,-8.5) AB16(2.5,-8.5) AB17(3.5,-8.5) AB18(4.5,-8.5) AB19(5.5,-8.5) AB20(6.5,-8.5) AB21(7.5,-8.5) AB22(8.5,-8.5) AB23(9.5,-8.5) AB24(10.5,-8.5) AB25(11.5,-8.5) AB26(12.5,-8.5) AC1(-12.5,-9.5) AC2(-11.5,-9.5) AC3(-10.5,-9.5) AC4(-9.5,-9.5) AC5(-8.5,-9.5) AC6(-7.5,-9.5) AC7(-6.5,-9.5) AC8(-5.5,-9.5) AC9(-4.5,-9.5) AC10(-3.5,-9.5) AC11(-2.5,-9.5) AC12(-1.5,-9.5) AC13(-0.5,-9.5) AC14(0.5,-9.5) AC15(1.5,-9.5) AC16(2.5,-9.5) AC17(3.5,-9.5) AC18(4.5,-9.5) AC19(5.5,-9.5) AC20(6.5,-9.5) AC21(7.5,-9.5) AC22(8.5,-9.5) AC23(9.5,-9.5) AC24(10.5,-9.5) AC25(11.5,-9.5) AC26(12.5,-9.5) AD1(-12.5,-10.5) AD2(-11.5,-10.5) AD3(-10.5,-10.5) AD4(-9.5,-10.5) AD5(-8.5,-10.5) AD6(-7.5,-10.5) AD7(-6.5,-10.5) AD8(-5.5,-10.5) AD9(-4.5,-10.5) AD10(-3.5,-10.5) AD11(-2.5,-10.5) AD12(-1.5,-10.5) AD13(-0.5,-10.5) AD14(0.5,-10.5) AD15(1.5,-10.5) AD16(2.5,-10.5) AD17(3.5,-10.5) AD18(4.5,-10.5) AD19(5.5,-10.5) AD20(6.5,-10.5) AD21(7.5,-10.5) AD22(8.5,-10.5) AD23(9.5,-10.5) AD24(10.5,-10.5) AD25(11.5,-10.5) AD26(12.5,-10.5) AE1(-12.5,-11.5) AE2(-11.5,-11.5) AE3(-10.5,-11.5) AE4(-9.5,-11.5) AE5(-8.5,-11.5) AE6(-7.5,-11.5) AE7(-6.5,-11.5) AE8(-5.5,-11.5) AE9(-4.5,-11.5) AE10(-3.5,-11.5) AE11(-2.5,-11.5) AE12(-1.5,-11.5) AE13(-0.5,-11.5) AE14(0.5,-11.5) AE15(1.5,-11.5) AE16(2.5,-11.5) AE17(3.5,-11.5) AE18(4.5,-11.5) AE19(5.5,-11.5) AE20(6.5,-11.5) AE21(7.5,-11.5) AE22(8.5,-11.5) AE23(9.5,-11.5) AE24(10.5,-11.5) AE25(11.5,-11.5) AE26(12.5,-11.5) AF1(-12.5,-12.5) AF2(-11.5,-12.5) AF3(-10.5,-12.5) AF4(-9.5,-12.5) AF5(-8.5,-12.5) AF6(-7.5,-12.5) AF7(-6.5,-12.5) AF8(-5.5,-12.5) AF9(-4.5,-12.5) AF10(-3.5,-12.5) AF11(-2.5,-12.5) AF12(-1.5,-12.5) AF13(-0.5,-12.5) AF14(0.5,-12.5) AF15(1.5,-12.5) AF16(2.5,-12.5) AF17(3.5,-12.5) AF18(4.5,-12.5) AF19(5.5,-12.5) AF20(6.5,-12.5) AF21(7.5,-12.5) AF22(8.5,-12.5) AF23(9.5,-12.5) AF24(10.5,-12.5) AF25(11.5,-12.5) AF26(12.5,-12.5) B1(-12.5,11.5) B2(-11.5,11.5) B3(-10.5,11.5) B4(-9.5,11.5) B5(-8.5,11.5) B6(-7.5,11.5) B7(-6.5,11.5) B8(-5.5,11.5) B9(-4.5,11.5) B10(-3.5,11.5) B11(-2.5,11.5) B12(-1.5,11.5) B13(-0.5,11.5) B14(0.5,11.5) B15(1.5,11.5) B16(2.5,11.5) B17(3.5,11.5) B18(4.5,11.5) B19(5.5,11.5) B20(6.5,11.5) B21(7.5,11.5) B22(8.5,11.5) B23(9.5,11.5) B24(10.5,11.5) B25(11.5,11.5) B26(12.5,11.5) C1(-12.5,10.5) C2(-11.5,10.5) C3(-10.5,10.5) C4(-9.5,10.5) C5(-8.5,10.5) C6(-7.5,10.5) C7(-6.5,10.5) C8(-5.5,10.5) C9(-4.5,10.5) C10(-3.5,10.5) C11(-2.5,10.5) C12(-1.5,10.5) C13(-0.5,10.5) C14(0.5,10.5) C15(1.5,10.5) C16(2.5,10.5) C17(3.5,10.5) C18(4.5,10.5) C19(5.5,10.5) C20(6.5,10.5) C21(7.5,10.5) C22(8.5,10.5) C23(9.5,10.5) C24(10.5,10.5) C25(11.5,10.5) C26(12.5,10.5) D1(-12.5,9.5) D2(-11.5,9.5) D3(-10.5,9.5) D4(-9.5,9.5) D5(-8.5,9.5) D6(-7.5,9.5) D7(-6.5,9.5) D8(-5.5,9.5) D9(-4.5,9.5) D10(-3.5,9.5) D11(-2.5,9.5) D12(-1.5,9.5) D13(-0.5,9.5) D14(0.5,9.5) D15(1.5,9.5) D16(2.5,9.5) D17(3.5,9.5) D18(4.5,9.5) D19(5.5,9.5) D20(6.5,9.5) D21(7.5,9.5) D22(8.5,9.5) D23(9.5,9.5) D24(10.5,9.5) D25(11.5,9.5) D26(12.5,9.5) E1(-12.5,8.5) E2(-11.5,8.5) E3(-10.5,8.5) E4(-9.5,8.5) E5(-8.5,8.5) E6(-7.5,8.5) E7(-6.5,8.5) E8(-5.5,8.5) E9(-4.5,8.5) E10(-3.5,8.5) E11(-2.5,8.5) E12(-1.5,8.5) E13(-0.5,8.5) E14(0.5,8.5) E15(1.5,8.5) E16(2.5,8.5) E17(3.5,8.5) E18(4.5,8.5) E19(5.5,8.5) E20(6.5,8.5) E21(7.5,8.5) E22(8.5,8.5) E23(9.5,8.5) E24(10.5,8.5) E25(11.5,8.5) E26(12.5,8.5) F1(-12.5,7.5) F2(-11.5,7.5) F3(-10.5,7.5) F4(-9.5,7.5) F5(-8.5,7.5) F6(-7.5,7.5) F7(-6.5,7.5) F8(-5.5,7.5) F9(-4.5,7.5) F10(-3.5,7.5) F11(-2.5,7.5) F12(-1.5,7.5) F13(-0.5,7.5) F14(0.5,7.5) F15(1.5,7.5) F16(2.5,7.5) F17(3.5,7.5) F18(4.5,7.5) F19(5.5,7.5) F20(6.5,7.5) F21(7.5,7.5) F22(8.5,7.5) F23(9.5,7.5) F24(10.5,7.5) F25(11.5,7.5) F26(12.5,7.5) G1(-12.5,6.5) G2(-11.5,6.5) G3(-10.5,6.5) G4(-9.5,6.5) G5(-8.5,6.5) G6(-7.5,6.5) G7(-6.5,6.5) G8(-5.5,6.5) G9(-4.5,6.5) G10(-3.5,6.5) G11(-2.5,6.5) G12(-1.5,6.5) G13(-0.5,6.5) G14(0.5,6.5) G15(1.5,6.5) G16(2.5,6.5) G17(3.5,6.5) G18(4.5,6.5) G19(5.5,6.5) G20(6.5,6.5) G21(7.5,6.5) G22(8.5,6.5) G23(9.5,6.5) G24(10.5,6.5) G25(11.5,6.5) G26(12.5,6.5) H1(-12.5,5.5) H2(-11.5,5.5) H3(-10.5,5.5) H4(-9.5,5.5) H5(-8.5,5.5) H6(-7.5,5.5) H7(-6.5,5.5) H8(-5.5,5.5) H9(-4.5,5.5) H10(-3.5,5.5) H11(-2.5,5.5) H12(-1.5,5.5) H13(-0.5,5.5) H14(0.5,5.5) H15(1.5,5.5) H16(2.5,5.5) H17(3.5,5.5) H18(4.5,5.5) H19(5.5,5.5) H20(6.5,5.5) H21(7.5,5.5) H22(8.5,5.5) H23(9.5,5.5) H24(10.5,5.5) H25(11.5,5.5) H26(12.5,5.5) J1(-12.5,4.5) J2(-11.5,4.5) J3(-10.5,4.5) J4(-9.5,4.5) J5(-8.5,4.5) J6(-7.5,4.5) J7(-6.5,4.5) J8(-5.5,4.5) J9(-4.5,4.5) J10(-3.5,4.5) J11(-2.5,4.5) J12(-1.5,4.5) J13(-0.5,4.5) J14(0.5,4.5) J15(1.5,4.5) J16(2.5,4.5) J17(3.5,4.5) J18(4.5,4.5) J19(5.5,4.5) J20(6.5,4.5) J21(7.5,4.5) J22(8.5,4.5) J23(9.5,4.5) J24(10.5,4.5) J25(11.5,4.5) J26(12.5,4.5) K1(-12.5,3.5) K2(-11.5,3.5) K3(-10.5,3.5) K4(-9.5,3.5) K5(-8.5,3.5) K6(-7.5,3.5) K7(-6.5,3.5) K8(-5.5,3.5) K9(-4.5,3.5) K10(-3.5,3.5) K11(-2.5,3.5) K12(-1.5,3.5) K13(-0.5,3.5) K14(0.5,3.5) K15(1.5,3.5) K16(2.5,3.5) K17(3.5,3.5) K18(4.5,3.5) K19(5.5,3.5) K20(6.5,3.5) K21(7.5,3.5) K22(8.5,3.5) K23(9.5,3.5) K24(10.5,3.5) K25(11.5,3.5) K26(12.5,3.5) L1(-12.5,2.5) L2(-11.5,2.5) L3(-10.5,2.5) L4(-9.5,2.5) L5(-8.5,2.5) L6(-7.5,2.5) L7(-6.5,2.5) L8(-5.5,2.5) L9(-4.5,2.5) L10(-3.5,2.5) L11(-2.5,2.5) L12(-1.5,2.5) L13(-0.5,2.5) L14(0.5,2.5) L15(1.5,2.5) L16(2.5,2.5) L17(3.5,2.5) L18(4.5,2.5) L19(5.5,2.5) L20(6.5,2.5) L21(7.5,2.5) L22(8.5,2.5) L23(9.5,2.5) L24(10.5,2.5) L25(11.5,2.5) L26(12.5,2.5) M1(-12.5,1.5) M2(-11.5,1.5) M3(-10.5,1.5) M4(-9.5,1.5) M5(-8.5,1.5) M6(-7.5,1.5) M7(-6.5,1.5) M8(-5.5,1.5) M9(-4.5,1.5) M10(-3.5,1.5) M11(-2.5,1.5) M12(-1.5,1.5) M13(-0.5,1.5) M14(0.5,1.5) M15(1.5,1.5) M16(2.5,1.5) M17(3.5,1.5) M18(4.5,1.5) M19(5.5,1.5) M20(6.5,1.5) M21(7.5,1.5) M22(8.5,1.5) M23(9.5,1.5) M24(10.5,1.5) M25(11.5,1.5) M26(12.5,1.5) N1(-12.5,0.5) N2(-11.5,0.5) N3(-10.5,0.5) N4(-9.5,0.5) N5(-8.5,0.5) N6(-7.5,0.5) N7(-6.5,0.5) N8(-5.5,0.5) N9(-4.5,0.5) N10(-3.5,0.5) N11(-2.5,0.5) N12(-1.5,0.5) N13(-0.5,0.5) N14(0.5,0.5) N15(1.5,0.5) N16(2.5,0.5) N17(3.5,0.5) N18(4.5,0.5) N19(5.5,0.5) N20(6.5,0.5) N21(7.5,0.5) N22(8.5,0.5) N23(9.5,0.5) N24(10.5,0.5) N25(11.5,0.5) N26(12.5,0.5) P1(-12.5,-0.5) P2(-11.5,-0.5) P3(-10.5,-0.5) P4(-9.5,-0.5) P5(-8.5,-0.5) P6(-7.5,-0.5) P7(-6.5,-0.5) P8(-5.5,-0.5) P9(-4.5,-0.5) P10(-3.5,-0.5) P11(-2.5,-0.5) P12(-1.5,-0.5) P13(-0.5,-0.5) P14(0.5,-0.5) P15(1.5,-0.5) P16(2.5,-0.5) P17(3.5,-0.5) P18(4.5,-0.5) P19(5.5,-0.5) P20(6.5,-0.5) P21(7.5,-0.5) P22(8.5,-0.5) P23(9.5,-0.5) P24(10.5,-0.5) P25(11.5,-0.5) P26(12.5,-0.5) R1(-12.5,-1.5) R2(-11.5,-1.5) R3(-10.5,-1.5) R4(-9.5,-1.5) R5(-8.5,-1.5) R6(-7.5,-1.5) R7(-6.5,-1.5) R8(-5.5,-1.5) R9(-4.5,-1.5) R10(-3.5,-1.5) R11(-2.5,-1.5) R12(-1.5,-1.5) R13(-0.5,-1.5) R14(0.5,-1.5) R15(1.5,-1.5) R16(2.5,-1.5) R17(3.5,-1.5) R18(4.5,-1.5) R19(5.5,-1.5) R20(6.5,-1.5) R21(7.5,-1.5) R22(8.5,-1.5) R23(9.5,-1.5) R24(10.5,-1.5) R25(11.5,-1.5) R26(12.5,-1.5) T1(-12.5,-2.5) T2(-11.5,-2.5) T3(-10.5,-2.5) T4(-9.5,-2.5) T5(-8.5,-2.5) T6(-7.5,-2.5) T7(-6.5,-2.5) T8(-5.5,-2.5) T9(-4.5,-2.5) T10(-3.5,-2.5) T11(-2.5,-2.5) T12(-1.5,-2.5) T13(-0.5,-2.5) T14(0.5,-2.5) T15(1.5,-2.5) T16(2.5,-2.5) T17(3.5,-2.5) T18(4.5,-2.5) T19(5.5,-2.5) T20(6.5,-2.5) T21(7.5,-2.5) T22(8.5,-2.5) T23(9.5,-2.5) T24(10.5,-2.5) T25(11.5,-2.5) T26(12.5,-2.5) U1(-12.5,-3.5) U2(-11.5,-3.5) U3(-10.5,-3.5) U4(-9.5,-3.5) U5(-8.5,-3.5) U6(-7.5,-3.5) U7(-6.5,-3.5) U8(-5.5,-3.5) U9(-4.5,-3.5) U10(-3.5,-3.5) U11(-2.5,-3.5) U12(-1.5,-3.5) U13(-0.5,-3.5) U14(0.5,-3.5) U15(1.5,-3.5) U16(2.5,-3.5) U17(3.5,-3.5) U18(4.5,-3.5) U19(5.5,-3.5) U20(6.5,-3.5) U21(7.5,-3.5) U22(8.5,-3.5) U23(9.5,-3.5) U24(10.5,-3.5) U25(11.5,-3.5) U26(12.5,-3.5) V1(-12.5,-4.5) V2(-11.5,-4.5) V3(-10.5,-4.5) V4(-9.5,-4.5) V5(-8.5,-4.5) V6(-7.5,-4.5) V7(-6.5,-4.5) V8(-5.5,-4.5) V9(-4.5,-4.5) V10(-3.5,-4.5) V11(-2.5,-4.5) V12(-1.5,-4.5) V13(-0.5,-4.5) V14(0.5,-4.5) V15(1.5,-4.5) V16(2.5,-4.5) V17(3.5,-4.5) V18(4.5,-4.5) V19(5.5,-4.5) V20(6.5,-4.5) V21(7.5,-4.5) V22(8.5,-4.5) V23(9.5,-4.5) V24(10.5,-4.5) V25(11.5,-4.5) V26(12.5,-4.5) W1(-12.5,-5.5) W2(-11.5,-5.5) W3(-10.5,-5.5) W4(-9.5,-5.5) W5(-8.5,-5.5) W6(-7.5,-5.5) W7(-6.5,-5.5) W8(-5.5,-5.5) W9(-4.5,-5.5) W10(-3.5,-5.5) W11(-2.5,-5.5) W12(-1.5,-5.5) W13(-0.5,-5.5) W14(0.5,-5.5) W15(1.5,-5.5) W16(2.5,-5.5) W17(3.5,-5.5) W18(4.5,-5.5) W19(5.5,-5.5) W20(6.5,-5.5) W21(7.5,-5.5) W22(8.5,-5.5) W23(9.5,-5.5) W24(10.5,-5.5) W25(11.5,-5.5) W26(12.5,-5.5) Y1(-12.5,-6.5) Y2(-11.5,-6.5) Y3(-10.5,-6.5) Y4(-9.5,-6.5) Y5(-8.5,-6.5) Y6(-7.5,-6.5) Y7(-6.5,-6.5) Y8(-5.5,-6.5) Y9(-4.5,-6.5) Y10(-3.5,-6.5) Y11(-2.5,-6.5) Y12(-1.5,-6.5) Y13(-0.5,-6.5) Y14(0.5,-6.5) Y15(1.5,-6.5) Y16(2.5,-6.5) Y17(3.5,-6.5) Y18(4.5,-6.5) Y19(5.5,-6.5) Y20(6.5,-6.5) Y21(7.5,-6.5) Y22(8.5,-6.5) Y23(9.5,-6.5) Y24(10.5,-6.5) Y25(11.5,-6.5) Y26(12.5,-6.5)
Top Layer:
  pour cut-out: -16,14.5 -15.9,13.95 -15.55,13.45 -15.05,13.1 -14.5,13 -13.95,13.1 -13.45,13.45 -13.1,13.95 -13,14.5 -13.15,15.15 -13.45,15.55 -13.85,15.85 -14.5,16 -15.15,15.85 -15.55,15.55 -15.85,15.15
  pour cut-out: 13,-14.5 13.1,-15.05 13.45,-15.55 13.95,-15.9 14.5,-16 15.05,-15.9 15.55,-15.55 15.9,-15.05 16,-14.5 15.85,-13.85 15.55,-13.45 15.15,-13.15 14.5,-13 13.85,-13.15 13.45,-13.45 13.15,-13.85
Top Overlay:
  circle w0.15: c-14.15,12.5 r0.25
  lines w0.15: -13.5,-13.5 13.5,-13.5 13.5,13.5 -13.5,13.5 -13.5,-13.5
Mechanical 1:
  lines w0.2: -13.5,-13.5 13.5,-13.5 13.5,13.5 -13.5,13.5 -13.5,-13.5 ; -12.6,12.1 -12,12.1 -12,12.7 -12.6,12.7 -12.6,12.1
3D body "fbg676.STEP": height 2.33, standoff 0, extent -13.5,-13.5 13.5,13.5